# Altium footprint library SparkFun.PCBLIB: 674 footprints (part 29 of 44)
Each footprint in its own frame and in the unit in brackets; x right, y up, seen from the top. Pads: shape width x height; smd on the part's side, far side on the other; paste and mask are expansions set on the pad; w line width, h text height; cw(c..) or ccw(c..) is an arc to the next point about the centre after c.
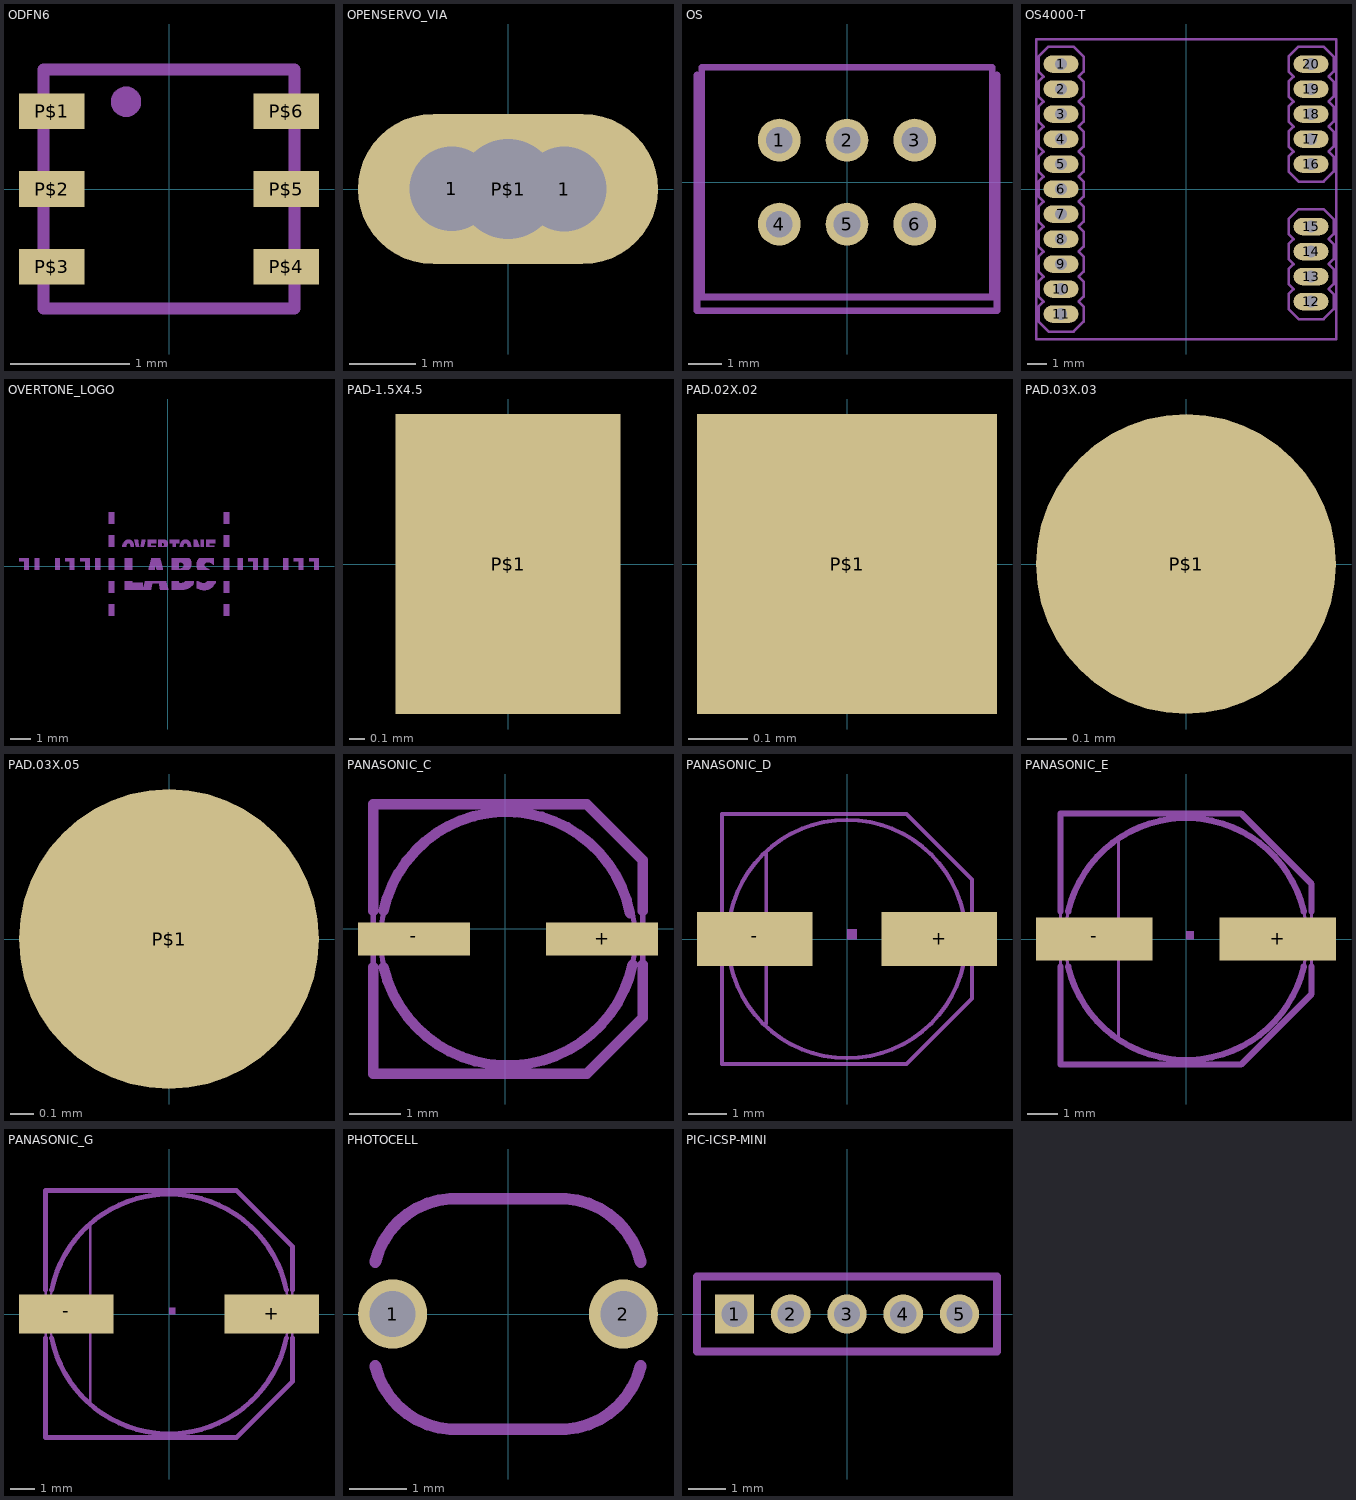
[diagram p28: the footprints below, top view; thin cyan lines are the x and y axes]

## ODFN6 [mm]
pads (6):
  rect 0.55x0.3 smd: P$1(-0.98,0.65) P$2(-0.98,0) P$3(-0.98,-0.65) P$4(0.98,-0.65) P$5(0.98,0) P$6(0.98,0.65)
Mechanical 2:
  circle w0.127: c-0.36,0.73 r0.064
  lines w0.1: -1.05,-1 1.05,-1 ; -1.05,1 1.05,1
Mechanical 18:
  lines w0.1: -1.05,-1 -1.05,1 ; 1.05,-1 1.05,1

## OPENSERVO_VIA [mil]
pads (3):
  round 50 hole 50: 1(-33.2,0.2) 1(33.2,0)
  oval 177.18x88.59 hole 59.06: P$1(0,0)
Mechanical 13:
  lines w5: -33,-32 cw(c-33.5,0) -33,32 31,32 ; -32,-32 32,-32 ; 33,-32 ccw(c33.5,0) 33,32

## OS [mil]
pads (6):
  round 50 hole 31: 1(-79,49) 2(0,49) 3(79,49) 4(-79,-49) 5(0,-49) 6(79,-49)
Mechanical 2:
  lines w8: -175,125 -175,-150 175,-150 175,125
Mechanical 18:
  lines w8: -169.5,-134 169.5,-134 169.5,134 -169.5,134 -169.5,-134

## OS4000-T [mil]
pads (20):
  oval 70x35 hole 24: 1(-250,250) 2(-250,200) 3(-250,150) 4(-250,100) 5(-250,50) 6(-250,0) 7(-250,-50) 8(-250,-100) 9(-250,-150) 10(-250,-200) 11(-250,-250) 12(250,-225) 13(250,-175) 14(250,-125) 15(250,-75) 16(250,50) 17(250,100) 18(250,150) 19(250,200) 20(250,250)
Mechanical 2:
  lines w5: -295,-265 -295,-235 -285,-225 -295,-215 -295,-185 -285,-175 -295,-165 -295,-135 -285,-125 -295,-115 -295,-85 -285,-75 -295,-65 -295,-35 -285,-25 -295,-15 -295,15 -285,25 -295,35 -295,65 -285,75 -295,85 -295,115 -285,125 -295,135 -295,165 -285,175 -295,185 -295,215 -285,225 -295,235 -295,265 -275,285 -225,285 -205,265 -205,235 -215,225 -205,215 -205,185 -215,175 -205,165 -205,135 -215,125 -205,115 -205,85 -215,75 -205,65 -205,35 -215,25 -205,15 -205,-15 -215,-25 -205,-35 -205,-65 -215,-75 -205,-85 -205,-115 -215,-125 -205,-135 -205,-165 -215,-175 -205,-185 -205,-215 -215,-225 -205,-235 -205,-265 -225,-285 -275,-285 -295,-265 ; 205,-240 205,-210 215,-200 205,-190 205,-160 215,-150 205,-140 205,-110 215,-100 205,-90 205,-60 225,-40 275,-40 295,-60 295,-90 285,-100 295,-110 295,-140 285,-150 295,-160 295,-190 285,-200 295,-210 295,-240 275,-260 225,-260 205,-240 ; 205,35 205,65 215,75 205,85 205,115 215,125 205,135 205,165 215,175 205,185 205,215 215,225 205,235 205,265 225,285 275,285 295,265 295,235 285,225 295,215 295,185 285,175 295,165 295,135 285,125 295,115 295,85 285,75 295,65 295,35 275,15 225,15 205,35
Mechanical 18:
  lines w5: -300,-300 -300,300 300,300 300,-300 -300,-300

## OVERTONE_LOGO [mil]
Mechanical 2:
  drawing of 1667 lines, arcs and shapes, not listed

## PAD-1.5X4.5 [mm]
pads (1):
  rect 1.5x2 smd: P$1(0,0)

## PAD.02X.02 [mil]
pads (1):
  rect 20x20 smd: P$1(0,0)

## PAD.03X.03 [mil]
pads (1):
  rrect100% 30x30 smd paste-15: P$1(0,0)

## PAD.03X.05 [mil]
pads (1):
  rrect100% 50x50 smd paste-25: P$1(0,0)

## PANASONIC_C [mm]
pads (2):
  rect 2.2x0.65 smd: +(1.9,-0.2) -(-1.8,-0.2)
Mechanical 2:
  lines w0.203: -2.6,-0.75 -2.6,-2.85 1.6,-2.85 2.7,-1.75 2.7,-0.7 ; -2.6,0.35 -2.6,2.45 1.6,2.45 2.7,1.35 2.7,0.35 ; -2.4,-0.75 ccw(c0.044,-0.175) 2.5,-0.7 ; -2.4,0.35 cw(c0.02,-0.175) 2.45,0.3
Mechanical 18:
  circle w0.102: c0.05,-0.2 r2.5
  lines w0.102: -2.6,-2.85 1.6,-2.85 2.7,-1.75 2.7,1.35 1.6,2.45 -2.6,2.45 -2.6,-2.85

## PANASONIC_D [mm]
pads (2):
  rect 3x1.4 smd: +(2.4,0) -(-2.4,0)
Mechanical 2:
  lines w0.102: -3.25,-0.95 -3.25,-3.25 1.55,-3.25 3.25,-1.55 3.25,-0.95 ; -3.25,0.95 -3.25,3.25 1.55,3.25 3.25,1.55 3.25,0.95 ; -2.95,-0.95 ccw(c0,0) 2.95,-0.95 ; -2.95,0.95 cw(c0,0) 2.95,0.95
Mechanical 18:
  circle w0.102: c0,0 r3.1
  rectangle: -3.65,-0.35 -3.05,0.35
  rectangle: 3.05,-0.35 3.65,0.35
  region: 0,0 0.254,0 0.254,0.254 0,0.254
  lines w0.102: -2.1,-2.2 -2.1,2.25 ; -3.25,-3.25 1.55,-3.25 3.25,-1.55 3.25,1.55 1.55,3.25 -3.25,3.25 -3.25,-3.25

## PANASONIC_E [mm]
pads (2):
  rect 3.8x1.4 smd: +(3,0) -(-3,0)
Mechanical 2:
  lines w0.203: -4.1,-0.9 -4.1,-4.1 1.8,-4.1 4.1,-1.8 4.1,-0.9 ; -4.1,0.9 -4.1,4.1 1.8,4.1 4.1,1.8 4.1,0.9 ; -3.85,-0.9 ccw(c0,0) 3.85,-0.9 ; -3.85,0.9 cw(c0,0) 3.85,0.9
Mechanical 18:
  circle w0.102: c0,0 r3.95
  rectangle: -4.5,-0.35 -3.8,0.35
  rectangle: 3.8,-0.35 4.5,0.35
  region: 0,0 0.254,0 0.254,0.254 0,0.254
  lines w0.102: -2.2,-3.25 -2.2,3.25 ; -4.1,-4.1 1.8,-4.1 4.1,-1.8 4.1,1.8 1.8,4.1 -4.1,4.1 -4.1,-4.1

## PANASONIC_G [mil]
pads (2):
  rect 153.54x62.99 smd: +(167.32,0) -(-167.32,0)
Mechanical 2:
  lines w8: -200.79,-39.37 -200.79,-200.79 110.24,-200.79 200.79,-110.24 200.79,-39.37 ; -200.79,39.37 -200.79,200.79 110.24,200.79 200.79,110.24 200.79,39.37 ; -190.94,-39.37 ccw(c0,0) 190.94,-39.37 ; -190.94,39.37 cw(c0,0) 190.94,39.37
Mechanical 18:
  circle w4: c0,0 r194.88
  rectangle: -230.32,-17.72 -192.91,17.72
  rectangle: 192.91,-17.72 230.32,17.72
  region: 0,0 10,0 10,10 0,10
  lines w4: -127.95,-143.7 -127.95,145.67 ; -200.79,-200.79 110.24,-200.79 200.79,-110.24 200.79,110.24 110.24,200.79 -200.79,200.79 -200.79,-200.79

## PHOTOCELL [mil]
pads (2):
  round 47.25 hole 31.5: 1(-78.74,0) 2(78.74,0)
Mechanical 2:
  lines w8: -90.55,-35.43 ccw(c-35.48,-22.25) -39.37,-78.74 39.37,-78.74 ccw(c35.48,-22.24) 90.55,-35.43 ; -90.55,35.43 cw(c-35.48,22.24) -39.37,78.74 39.37,78.74 cw(c35.48,22.25) 90.55,35.43

## PIC-ICSP-MINI [mm]
pads (5):
  rect 1.05x1.05 hole 0.7: 1(-3,0)
  round 1.05 hole 0.7: 2(-1.5,0) 3(0,0) 4(1.5,0) 5(3,0)
Mechanical 2:
  lines w0.203: -3.6,1 -2.4,1
Mechanical 18:
  lines w0.203: -4,-1 -4,1 4,1 4,-1 -4,-1

## PLASTIC_SMALL_OUTLINE [mil]